# Altium footprint library 贴片电感.PcbLib: 92 footprints (part 6 of 6)
Each footprint in its own frame and in the unit in brackets; x right, y up, seen from the top. Pads: shape width x height; smd on the part's side, far side on the other; paste and mask are expansions set on the pad; w line width, h text height; cw(c..) or ccw(c..) is an arc to the next point about the centre after c.
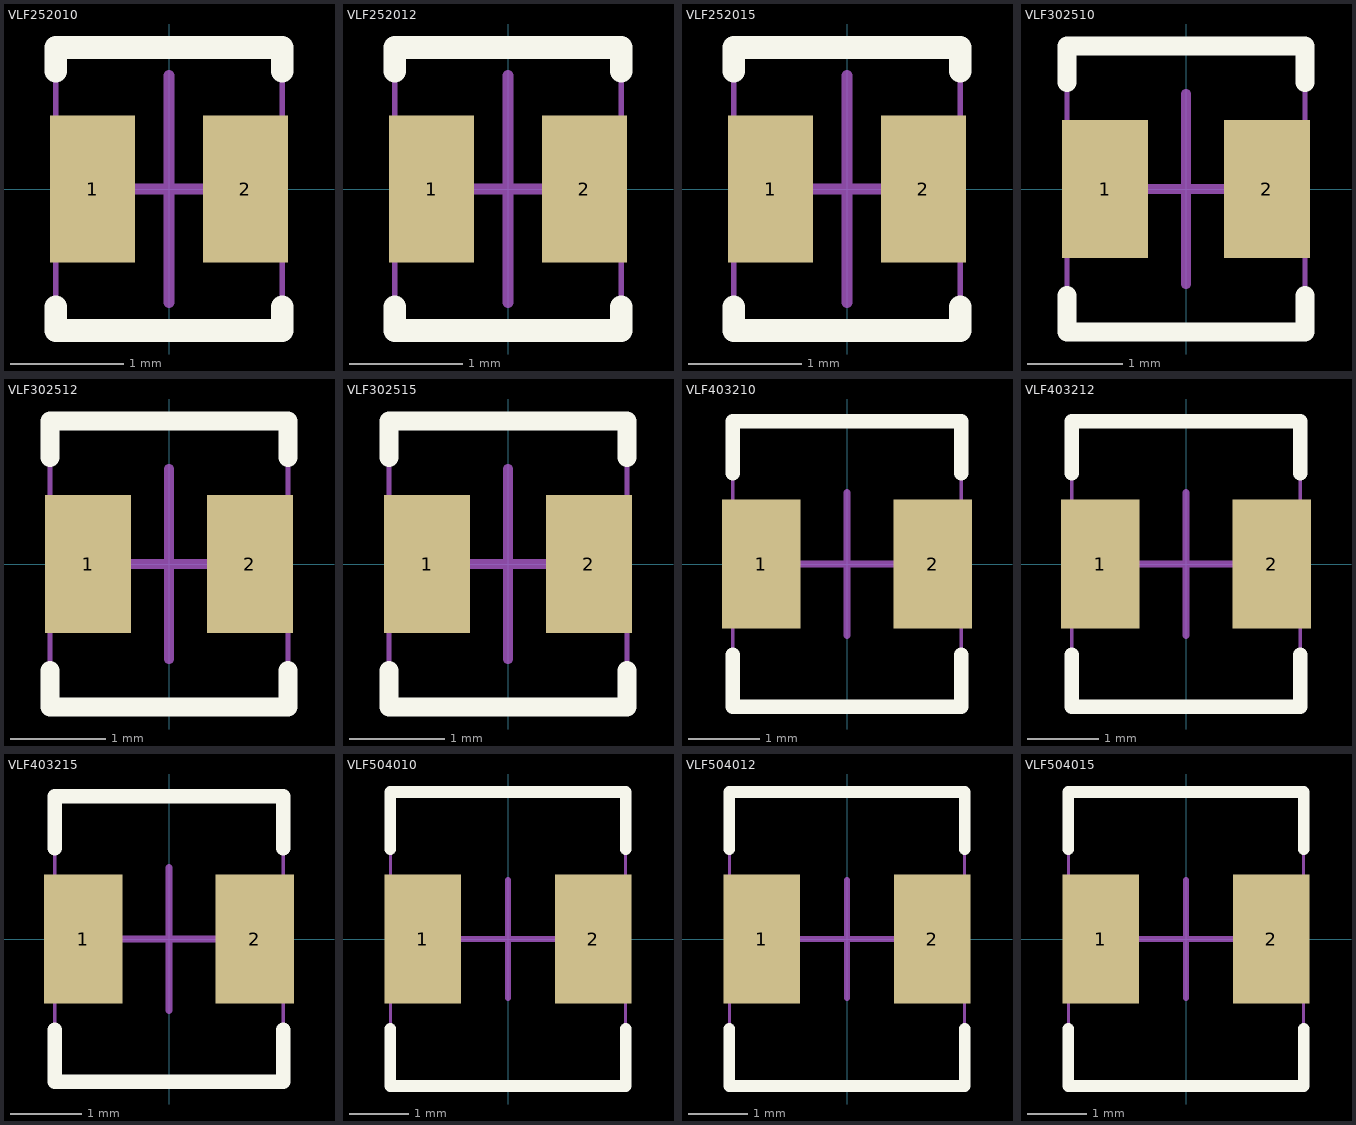
[diagram p5: the footprints below, top view; thin cyan lines are the x and y axes]

## VLF252010 [mm] "TDK 贴片蔽磁电感"
height 1
pads (2):
  rect 0.75x1.3 smd: 1(-0.675,0) 2(0.675,0)
Top Overlay:
  lines w0.2: -1,-1.041 -1,-1.25 1,-1.25 1,-1.041 ; -1,1.041 -1,1.25 1,1.25 1,1.041
Mechanical 13:
  lines w0.05: -1,-1.25 1,-1.25 1,1.25 -1,1.25 -1,-1.25
Mechanical 15:
  lines w0.1: -1,0 1,0 ; 0,-1 0,1
3D body: height 1, standoff 0, extent -1,-1.25 1,1.25

## VLF252012 [mm] "TDK 贴片蔽磁电感"
height 1.2
pads (2):
  rect 0.75x1.3 smd: 1(-0.675,0) 2(0.675,0)
Top Overlay:
  lines w0.2: -1,-1.041 -1,-1.25 1,-1.25 1,-1.041 ; -1,1.041 -1,1.25 1,1.25 1,1.041
Mechanical 13:
  lines w0.05: -1,-1.25 -1,1.25 1,1.25 1,-1.25 -1,-1.25
Mechanical 15:
  lines w0.1: -1,0 1,0 ; 0,-1 0,1
3D body: height 1.2, standoff 0, extent -1,-1.25 1,1.25

## VLF252015 [mm] "TDK 贴片蔽磁电感"
height 1.5
pads (2):
  rect 0.75x1.3 smd: 1(-0.675,0) 2(0.675,0)
Top Overlay:
  lines w0.2: -1,-1.041 -1,-1.25 1,-1.25 1,-1.041 ; -1,1.041 -1,1.25 1,1.25 1,1.041
Mechanical 13:
  lines w0.05: -1,-1.25 1,-1.25 1,1.25 -1,1.25 -1,-1.25
Mechanical 15:
  lines w0.1: -1,0 1,0 ; 0,-1 0,1
3D body: height 1.51, standoff 0, extent -1,-1.25 1,1.25

## VLF302510 [mm] "TDK 贴片蔽磁电感"
height 1
pads (2):
  rect 0.9x1.45 smd: 1(-0.85,0) 2(0.85,0)
Top Overlay:
  lines w0.2: -1.25,-1.118 -1.25,-1.5 1.25,-1.5 1.25,-1.118 ; -1.25,1.118 -1.25,1.5 1.25,1.5 1.25,1.118
Mechanical 13:
  lines w0.05: -1.25,-1.5 1.25,-1.5 1.25,1.5 -1.25,1.5 -1.25,-1.5
Mechanical 15:
  lines w0.1: -1,0 1,0 ; 0,-1 0,1
3D body: height 1, standoff 0, extent -1.25,-1.5 1.25,1.5

## VLF302512 [mm] "TDK 贴片蔽磁电感"
height 1.2
pads (2):
  rect 0.9x1.45 smd: 1(-0.85,0) 2(0.85,0)
Top Overlay:
  lines w0.2: -1.25,-1.118 -1.25,-1.5 1.25,-1.5 1.25,-1.118 ; -1.25,1.118 -1.25,1.5 1.25,1.5 1.25,1.118
Mechanical 13:
  lines w0.05: -1.25,-1.5 1.25,-1.5 1.25,1.5 -1.25,1.5 -1.25,-1.5
Mechanical 15:
  lines w0.1: -1,0 1,0 ; 0,-1 0,1
3D body: height 1.2, standoff 0, extent -1.25,-1.5 1.25,1.5

## VLF302515 [mm] "TDK 贴片蔽磁电感"
height 1.5
pads (2):
  rect 0.9x1.45 smd: 1(-0.85,0) 2(0.85,0)
Top Overlay:
  lines w0.2: -1.25,-1.118 -1.25,-1.5 1.25,-1.5 1.25,-1.118 ; -1.25,1.118 -1.25,1.5 1.25,1.5 1.25,1.118
Mechanical 13:
  lines w0.05: -1.25,-1.5 1.25,-1.5 1.25,1.5 -1.25,1.5 -1.25,-1.5
Mechanical 15:
  lines w0.1: -1,0 1,0 ; 0,-1 0,1
3D body: height 1.51, standoff 0, extent -1.25,-1.5 1.25,1.5

## VLF403210 [mm] "TDK 贴片蔽磁电感"
height 1
pads (2):
  rect 1.1x1.8 smd: 1(-1.2,0) 2(1.2,0)
Top Overlay:
  lines w0.2: -1.6,-1.27 -1.6,-2 1.6,-2 1.6,-1.27 ; -1.6,1.27 -1.6,2 1.6,2 1.6,1.27
Mechanical 13:
  lines w0.05: -1.6,-2 1.6,-2 1.6,2 -1.6,2 -1.6,-2
Mechanical 15:
  lines w0.1: -1,0 1,0 ; 0,-1 0,1
3D body: height 1, standoff 0, extent -1.6,-2 1.6,2

## VLF403212 [mm] "TDK 贴片蔽磁电感"
height 1.2
pads (2):
  rect 1.1x1.8 smd: 1(-1.2,0) 2(1.2,0)
Top Overlay:
  lines w0.2: -1.6,-1.27 -1.6,-2 1.6,-2 1.6,-1.27 ; -1.6,1.27 -1.6,2 1.6,2 1.6,1.27
Mechanical 13:
  lines w0.05: -1.6,-2 -1.6,2 1.6,2 1.6,-2 -1.6,-2
Mechanical 15:
  lines w0.1: -1,0 1,0 ; 0,-1 0,1
3D body: height 1.2, standoff 0, extent -1.6,-2 1.6,2

## VLF403215 [mm] "TDK 贴片蔽磁电感"
height 1.5
pads (2):
  rect 1.1x1.8 smd: 1(-1.2,0) 2(1.2,0)
Top Overlay:
  lines w0.2: -1.6,-1.27 -1.6,-2 1.6,-2 1.6,-1.27 ; -1.6,1.27 -1.6,2 1.6,2 1.6,1.27
Mechanical 13:
  lines w0.05: -1.6,-2 1.6,-2 1.6,2 -1.6,2 -1.6,-2
Mechanical 15:
  lines w0.1: -1,0 1,0 ; 0,-1 0,1
3D body: height 1.51, standoff 0, extent -1.6,-2 1.6,2

## VLF504010 [mm] "TDK 贴片蔽磁电感"
height 1
pads (2):
  rect 1.3x2.2 smd: 1(-1.45,0) 2(1.45,0)
Top Overlay:
  lines w0.2: -2,-1.524 -2,-2.5 2,-2.5 2,-1.524 ; -2,1.524 -2,2.5 2,2.5 2,1.524
Mechanical 13:
  lines w0.05: -2,-2.5 -2,2.5 2,2.5 2,-2.5 -2,-2.5
Mechanical 15:
  lines w0.1: -1,0 1,0 ; 0,-1 0,1
3D body: height 1, standoff 0, extent -2,-2.5 2,2.5

## VLF504012 [mm] "TDK贴片蔽磁电感"
height 1.2
pads (2):
  rect 1.3x2.2 smd: 1(-1.45,0) 2(1.45,0)
Top Overlay:
  lines w0.2: -2,-1.524 -2,-2.5 2,-2.5 2,-1.524 ; -2,1.524 -2,2.5 2,2.5 2,1.524
Mechanical 13:
  lines w0.05: -2,-2.5 -2,2.5 2,2.5 2,-2.5 -2,-2.5
Mechanical 15:
  lines w0.1: -1,0 1,0 ; 0,-1 0,1
3D body: height 1.2, standoff 0, extent -2,-2.5 2,2.5

## VLF504015 [mm] "TDK贴片蔽磁电感"
height 1.5
pads (2):
  rect 1.3x2.2 smd: 1(-1.45,0) 2(1.45,0)
Top Overlay:
  lines w0.2: -2,-1.524 -2,-2.5 2,-2.5 2,-1.524 ; -2,1.524 -2,2.5 2,2.5 2,1.524
Mechanical 13:
  lines w0.05: -2,-2.5 -2,2.5 2,2.5 2,-2.5 -2,-2.5
Mechanical 15:
  lines w0.1: -1,0 1,0 ; 0,-1 0,1
3D body: height 1.51, standoff 0, extent -2,-2.5 2,2.5